# Altium footprint library POT_TH.PcbLib: 65 footprints (part 5 of 5)
Each footprint in its own frame and in the unit in brackets; x right, y up, seen from the top. Pads: shape width x height; smd on the part's side, far side on the other; paste and mask are expansions set on the pad; w line width, h text height; cw(c..) or ccw(c..) is an arc to the next point about the centre after c.
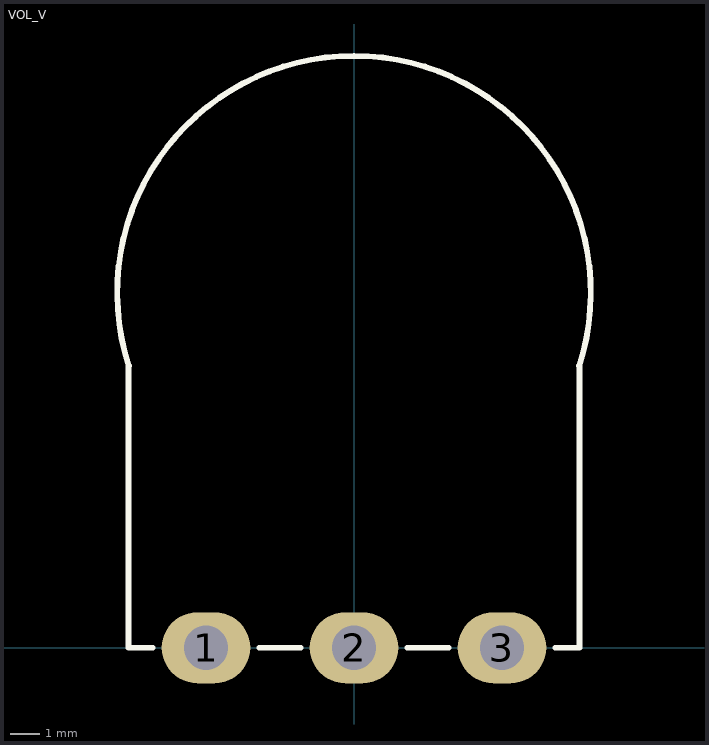
[diagram p4: the footprint, top view; thin cyan lines are the x and y axes]

## VOL_V [mm] "VOULME VERTICAL"
height 0.508
pads (3):
  oval 3x2.4 hole 1.5: 1(-5,0) 2(0,0) 3(5,0)
Top Overlay:
  lines w0.2: -7.62,9.5 -7.62,0 -6.8,0 ; -7.608,9.528 cw(c0,12) 7.608,9.528 ; -3.2,0 -1.8,0 ; 1.8,0 3.2,0 ; 6.8,0 7.62,0 7.62,9.5
3D body "volome cover2.STEP": height 31.2, standoff 11.2, extent -7.666,4.388 9.444,19.558
3D body "Standard Potentiometer - Vertical (No Value).STEP": height 24.26, standoff -1.74, extent -8.564,-0.338 8.636,20.912